# Altium footprint library 1.01-电阻.PcbLib: 78 footprints (part 3 of 5)
Each footprint in its own frame and in the unit in brackets; x right, y up, seen from the top. Pads: shape width x height; smd on the part's side, far side on the other; paste and mask are expansions set on the pad; w line width, h text height; cw(c..) or ccw(c..) is an arc to the next point about the centre after c.
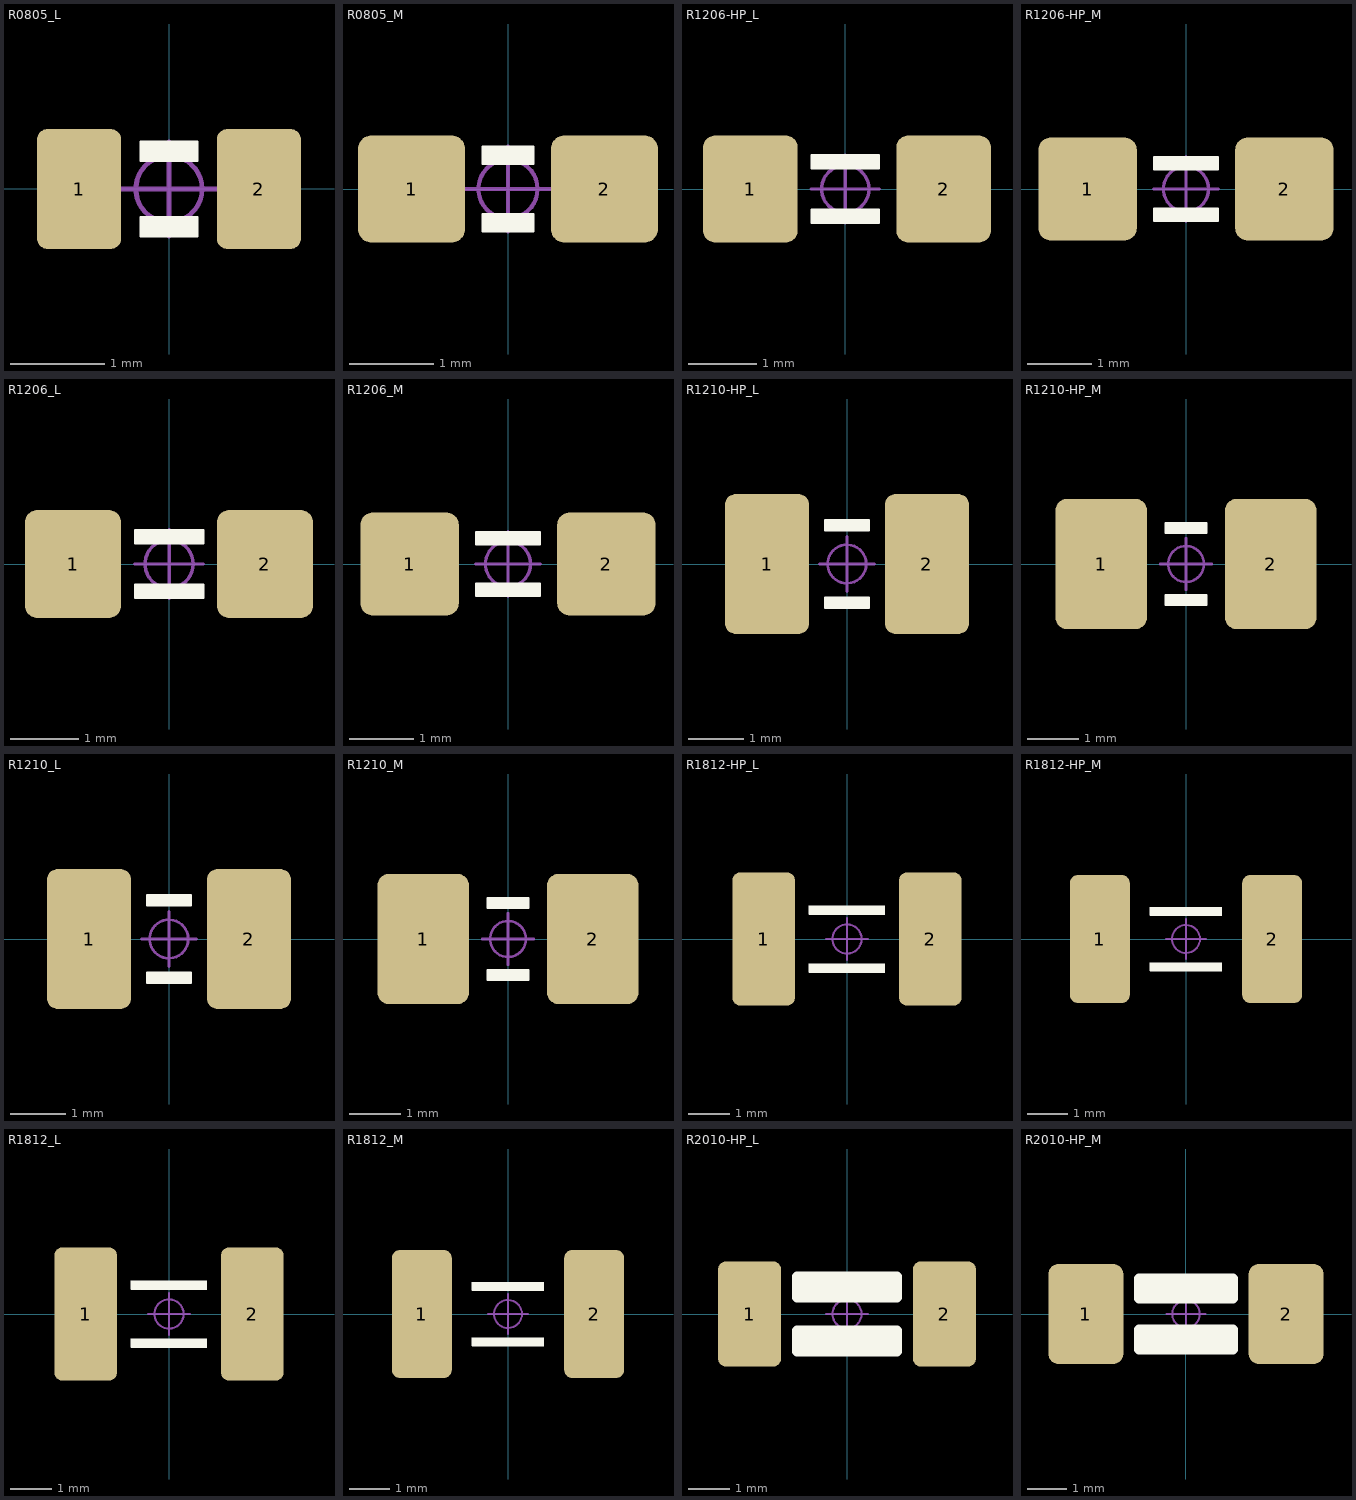
[diagram p2: the footprints below, top view; thin cyan lines are the x and y axes]

## R0805_L [mil] "1/8W贴片电阻"
pads (2):
  rrect25% 35x50 smd: 1(-37.4,0) 2(37.4,0)
Top Overlay:
  region: -11.81,-19.68 -11.81,-11.81 11.81,-11.81 11.81,-19.68
  region: 11.81,19.68 11.81,11.81 -11.81,11.81 -11.81,19.68
  lines w1: -11.81,-19.68 0,-19.68 11.81,-19.68 11.81,-11.81 3.94,-11.81 -11.81,-11.81 -11.81,-19.68 ; -11.81,11.81 -11.81,19.68 0,19.68 11.81,19.68 11.81,11.81 -3.94,11.81 -11.81,11.81
Mechanical 15:
  circle w1.97: c0,0 r13.78
  lines w1.97: -19.68,0 19.68,0 ; 0,-19.68 0,19.68
3D body "R0805.STEP": height 20.72, standoff 1, extent -39.36,-24.6 39.38,24.61

## R0805_M [mil] "1/8W贴片电阻"
pads (2):
  rrect25% 50x50 smd: 1(-45,0) 2(45,0)
Top Overlay:
  region: 11.81,19.68 11.81,11.81 -11.81,11.81 -11.81,19.68
  region: -11.81,-19.68 -11.81,-11.81 11.81,-11.81 11.81,-19.68
  lines w1: -11.81,-19.68 -11.81,-11.81 3.94,-11.81 11.81,-11.81 11.81,-19.68 0,-19.68 -11.81,-19.68 ; -11.81,11.81 -3.94,11.81 11.81,11.81 11.81,19.68 0,19.68 -11.81,19.68 -11.81,11.81
Mechanical 15:
  circle w1.97: c0,0 r13.78
  lines w1.97: -19.68,0 19.68,0 ; 0,-19.68 0,19.68
3D body "R0805.STEP": height 20.72, standoff 1, extent -39.36,-24.6 39.38,24.61

## R1206-HP_L [mil] "1/4W高精度贴片电阻"
pads (2):
  rrect25% 55x62 smd: 1(-55.12,0) 2(57.09,0)
Top Overlay:
  region: 19.68,-11.81 19.68,-19.68 -19.68,-19.68 -19.68,-11.81
  region: -19.68,11.81 -19.68,19.68 19.68,19.68 19.68,11.81
  lines w1: -19.68,-19.68 -19.68,-11.81 19.68,-11.81 19.68,-19.68 -19.68,-19.68 ; -19.68,11.81 -19.68,19.68 19.68,19.68 19.68,11.81 -19.68,11.81
Mechanical 15:
  circle w1.97: c0,0 r13.78
  lines w1.97: -19.68,0 19.68,0 ; 0,-19.68 0,19.68
3D body "R1206-HP.STEP": height 22.69, standoff 1, extent -62.99,-31.49 63,31.5

## R1206-HP_M [mil] "1/4W高精度贴片电阻"
pads (2):
  rrect25% 60x62.99 smd: 1(-60,0) 2(60,0)
Top Overlay:
  region: -19.68,11.81 -19.68,19.68 19.68,19.68 19.68,11.81
  region: 19.68,-11.81 19.68,-19.68 -19.68,-19.68 -19.68,-11.81
  lines w1: -19.68,-19.68 19.68,-19.68 19.68,-11.81 -19.68,-11.81 -19.68,-19.68 ; -19.68,11.81 19.68,11.81 19.68,19.68 -19.68,19.68 -19.68,11.81
Mechanical 15:
  circle w1.97: c0,0 r13.78
  lines w1.97: -19.68,0 19.68,0 ; 0,-19.68 0,19.68
3D body "R1206-HP.STEP": height 22.69, standoff 1, extent -62.99,-31.49 63,31.5

## R1206_L [mil] "1/4W贴片电阻"
pads (2):
  rrect25% 55x62 smd: 1(-55.12,0) 2(55,0)
Top Overlay:
  region: 19.68,-11.81 19.68,-19.68 -19.68,-19.68 -19.68,-11.81
  region: -19.68,11.81 -19.68,19.68 19.68,19.68 19.68,11.81
  lines w1: -19.68,-19.68 -19.68,-11.81 19.68,-11.81 19.68,-19.68 -19.68,-19.68 ; -19.68,11.81 -19.68,19.68 19.68,19.68 19.68,11.81 -19.68,11.81
Mechanical 15:
  circle w1.97: c0,0 r13.78
  lines w1.97: -19.68,0 19.68,0 ; 0,-19.68 0,19.68
3D body "R1206.STEP": height 21.69, standoff 0, extent -62.99,-31.49 63,31.5

## R1206_M [mil] "1/4W贴片电阻"
pads (2):
  rrect25% 60x62.99 smd: 1(-60,0) 2(60,0)
Top Overlay:
  region: 19.68,-11.81 19.68,-19.68 -19.68,-19.68 -19.68,-11.81
  region: -19.68,11.81 -19.68,19.68 19.68,19.68 19.68,11.81
  lines w1: -19.68,-19.68 -19.68,-11.81 19.68,-11.81 19.68,-19.68 -19.68,-19.68 ; -19.68,11.81 -19.68,19.68 19.68,19.68 19.68,11.81 -19.68,11.81
Mechanical 15:
  circle w1.97: c0,0 r13.78
  lines w1.97: -19.68,0 19.68,0 ; 0,-19.68 0,19.68
3D body "R1206.STEP": height 22.69, standoff 1, extent -62.99,-31.49 63,31.5

## R1210-HP_L [mm] "1/3W高精度贴片电阻                淘宝ID:黄晶宝石"
pads (2):
  rrect25% 1.524x2.54 smd: 1(-1.45,0) 2(1.45,0)
Top Overlay:
  region: -0.4,0.6 0.4,0.6 0.4,0.8 -0.4,0.8
  region: 0.4,-0.6 -0.4,-0.6 -0.4,-0.8 0.4,-0.8
  lines w0.025: -0.4,-0.8 0.4,-0.8 0.4,-0.6 -0.4,-0.6 -0.4,-0.8 ; -0.4,0.6 -0.4,0.8 0.4,0.8 0.4,0.6 -0.4,0.6
Mechanical 15:
  circle w0.05: c0,0 r0.35
  lines w0.05: -0.5,0 0.5,0 ; 0,-0.5 0,0.5
3D body "R1210-HP.STEP": height 0.58, standoff 0.03, extent -1.6,-1.25 1.6,1.25

## R1210-HP_M [mil] "1/3W高精度贴片电阻                淘宝ID:黄晶宝石"
pads (2):
  rrect25% 70x100 smd: 1(-65,0) 2(65,0)
Top Overlay:
  region: -15.75,23.62 15.75,23.62 15.75,31.5 -15.75,31.5
  region: 15.75,-23.62 -15.75,-23.62 -15.75,-31.5 15.75,-31.5
  lines w1: -15.75,-31.5 15.75,-31.5 15.75,-23.62 -15.75,-23.62 -15.75,-31.5 ; -15.75,23.62 -15.75,31.5 15.75,31.5 15.75,23.62 -15.75,23.62
Mechanical 15:
  circle w1.97: c0,0 r13.78
  lines w1.97: -19.68,0 19.68,0 ; 0,-19.68 0,19.68
3D body "R1210-HP.STEP": height 22.69, standoff 1, extent -62.99,-49.21 63,49.22

## R1210_L [mm] "1/3W贴片电阻                淘宝ID:黄晶宝石"
pads (2):
  rrect25% 1.524x2.54 smd: 1(-1.45,0) 2(1.45,0)
Top Overlay:
  region: 0.4,-0.6 -0.4,-0.6 -0.4,-0.8 0.4,-0.8
  region: -0.4,0.6 0.4,0.6 0.4,0.8 -0.4,0.8
  lines w0.025: -0.4,-0.8 -0.4,-0.6 0.4,-0.6 0.4,-0.8 -0.4,-0.8 ; -0.4,0.6 0.4,0.6 0.4,0.8 -0.4,0.8 -0.4,0.6
Mechanical 15:
  circle w0.05: c0,0 r0.35
  lines w0.05: -0.5,0 0.5,0 ; 0,-0.5 0,0.5
3D body "1210_-2asm.STEP": height 0.58, standoff 0.03, extent -1.575,-1.25 1.625,1.25

## R1210_M [mil] "1/3W贴片电阻                淘宝ID:黄晶宝石"
pads (2):
  rrect25% 70x100 smd: 1(-65,0) 2(65,0)
Top Overlay:
  region: -15.75,23.62 15.75,23.62 15.75,31.5 -15.75,31.5
  region: 15.75,-23.62 -15.75,-23.62 -15.75,-31.5 15.75,-31.5
  lines w1: -15.75,-31.5 15.75,-31.5 15.75,-23.62 -15.75,-23.62 -15.75,-31.5 ; -15.75,23.62 -15.75,31.5 15.75,31.5 15.75,23.62 -15.75,23.62
Mechanical 15:
  circle w1.97: c0,0 r13.78
  lines w1.97: -19.68,0 19.68,0 ; 0,-19.68 0,19.68
3D body "1210_-2asm.STEP": height 21.69, standoff 0, extent -62.98,-49.21 63,49.22

## R1812-HP_L [mm] "1/2W高精度贴片电阻                淘宝ID:黄晶宝石"
pads (2):
  rrect25% 1.5x3.2 smd: 1(-2,0) 2(2,0)
Top Overlay:
  region: -0.9,0.6 0.9,0.6 0.9,0.8 -0.9,0.8
  region: 0.9,-0.6 -0.9,-0.6 -0.9,-0.8 0.9,-0.8
  lines w0.025: -0.9,-0.8 -0.9,-0.6 0.9,-0.6 0.9,-0.8 -0.9,-0.8 ; -0.9,0.6 0.9,0.6 0.9,0.8 -0.9,0.8 -0.9,0.6
Mechanical 15:
  circle w0.05: c0,0 r0.35
  lines w0.05: -0.5,0 0.5,0 ; 0,-0.5 0,0.5
3D body "R1812-HP.STEP": height 0.58, standoff 0.03, extent -2.25,-1.6 2.25,1.6

## R1812-HP_M [mm] "1/2W高精度贴片电阻                 淘宝ID:黄晶宝石"
pads (2):
  rrect25% 1.5x3.2 smd: 1(-2.159,0) 2(2.159,0)
Top Overlay:
  region: -0.9,0.6 0.9,0.6 0.9,0.8 -0.9,0.8
  region: 0.9,-0.6 -0.9,-0.6 -0.9,-0.8 0.9,-0.8
  lines w0.025: -0.9,-0.8 -0.9,-0.6 0.9,-0.6 0.9,-0.8 -0.9,-0.8 ; -0.9,0.6 0.9,0.6 0.9,0.8 -0.9,0.8 -0.9,0.6
Mechanical 15:
  circle w0.05: c0,0 r0.35
  lines w0.05: -0.5,0 0.5,0 ; 0,-0.5 0,0.5
3D body "R1812-HP.STEP": height 0.58, standoff 0.03, extent -2.25,-1.6 2.25,1.6

## R1812_L [mm] "1/2W贴片电阻                 淘宝ID:黄晶宝石"
pads (2):
  rrect25% 1.5x3.2 smd: 1(-2,0) 2(2,0)
Top Overlay:
  region: -0.9,0.6 0.9,0.6 0.9,0.8 -0.9,0.8
  region: 0.9,-0.6 -0.9,-0.6 -0.9,-0.8 0.9,-0.8
  lines w0.025: -0.9,-0.8 -0.9,-0.6 0.9,-0.6 0.9,-0.8 -0.9,-0.8 ; -0.9,0.6 0.9,0.6 0.9,0.8 -0.9,0.8 -0.9,0.6
Mechanical 15:
  circle w0.05: c0,0 r0.35
  lines w0.05: -0.5,0 0.5,0 ; 0,-0.5 0,0.5
3D body "R1812.STEP": height 0.58, standoff 0.03, extent -2.25,-1.6 2.25,1.6

## R1812_M [mm] "1/2W贴片电阻                淘宝ID:黄晶宝石"
pads (2):
  rrect25% 1.5x3.2 smd: 1(-2.159,0) 2(2.159,0)
Top Overlay:
  region: 0.9,-0.6 -0.9,-0.6 -0.9,-0.8 0.9,-0.8
  region: -0.9,0.6 0.9,0.6 0.9,0.8 -0.9,0.8
  lines w0.025: -0.9,-0.8 0.9,-0.8 0.9,-0.6 -0.9,-0.6 -0.9,-0.8 ; -0.9,0.6 -0.9,0.8 0.9,0.8 0.9,0.6 -0.9,0.6
Mechanical 15:
  circle w0.05: c0,0 r0.35
  lines w0.05: -0.5,0 0.5,0 ; 0,-0.5 0,0.5
3D body "R1812.STEP": height 0.58, standoff 0.03, extent -2.25,-1.6 2.25,1.6

## R2010-HP_L [mm] "3/4W高精度贴片电阻                 淘宝ID:黄晶宝石"
pads (2):
  rrect25% 1.52x2.54 smd: 1(-2.35,0) 2(2.35,0)
Top Overlay:
  region: 1.2,-0.4 -1.2,-0.4 -1.2,-0.9 1.2,-0.9
  region: -1.2,0.4 1.2,0.4 1.2,0.9 -1.2,0.9
  lines w0.254: -1.2,-0.9 -1.2,-0.4 1.2,-0.4 1.2,-0.9 -0.7,-0.9 -1.2,-0.9 ; -1.2,0.4 -1.2,0.9 0.7,0.9 1.2,0.9 1.2,0.4 -1.2,0.4
Mechanical 15:
  circle w0.05: c0,0 r0.35
  lines w0.05: -0.5,0 0.5,0 ; 0,-0.5 0,0.5
3D body "R2010-HP.STEP": height 0.58, standoff 0.03, extent -2.5,-1.25 2.5,1.25

## R2010-HP_M [mm] "3/4W高精度贴片电阻                 淘宝ID:黄晶宝石"
pads (2):
  rrect25% 1.905x2.54 smd: 1(-2.55,0) 2(2.55,0)
Top Overlay:
  region: -1.2,0.4 1.2,0.4 1.2,0.9 -1.2,0.9
  region: 1.2,-0.4 -1.2,-0.4 -1.2,-0.9 1.2,-0.9
  lines w0.254: -1.2,-0.9 -0.7,-0.9 1.2,-0.9 1.2,-0.4 -1.2,-0.4 -1.2,-0.9 ; -1.2,0.4 1.2,0.4 1.2,0.9 0.7,0.9 -1.2,0.9 -1.2,0.4
Mechanical 15:
  circle w0.05: c0,0 r0.35
  lines w0.05: -0.5,0 0.5,0 ; 0,-0.5 0,0.5
3D body "R2010-HP.STEP": height 0.58, standoff 0.03, extent -2.5,-1.25 2.5,1.25